# Altium footprint library Chip_Packaging.PcbLib: 101 footprints (part 4 of 7)
Each footprint in its own frame and in the unit in brackets; x right, y up, seen from the top. Pads: shape width x height; smd on the part's side, far side on the other; paste and mask are expansions set on the pad; w line width, h text height; cw(c..) or ccw(c..) is an arc to the next point about the centre after c.
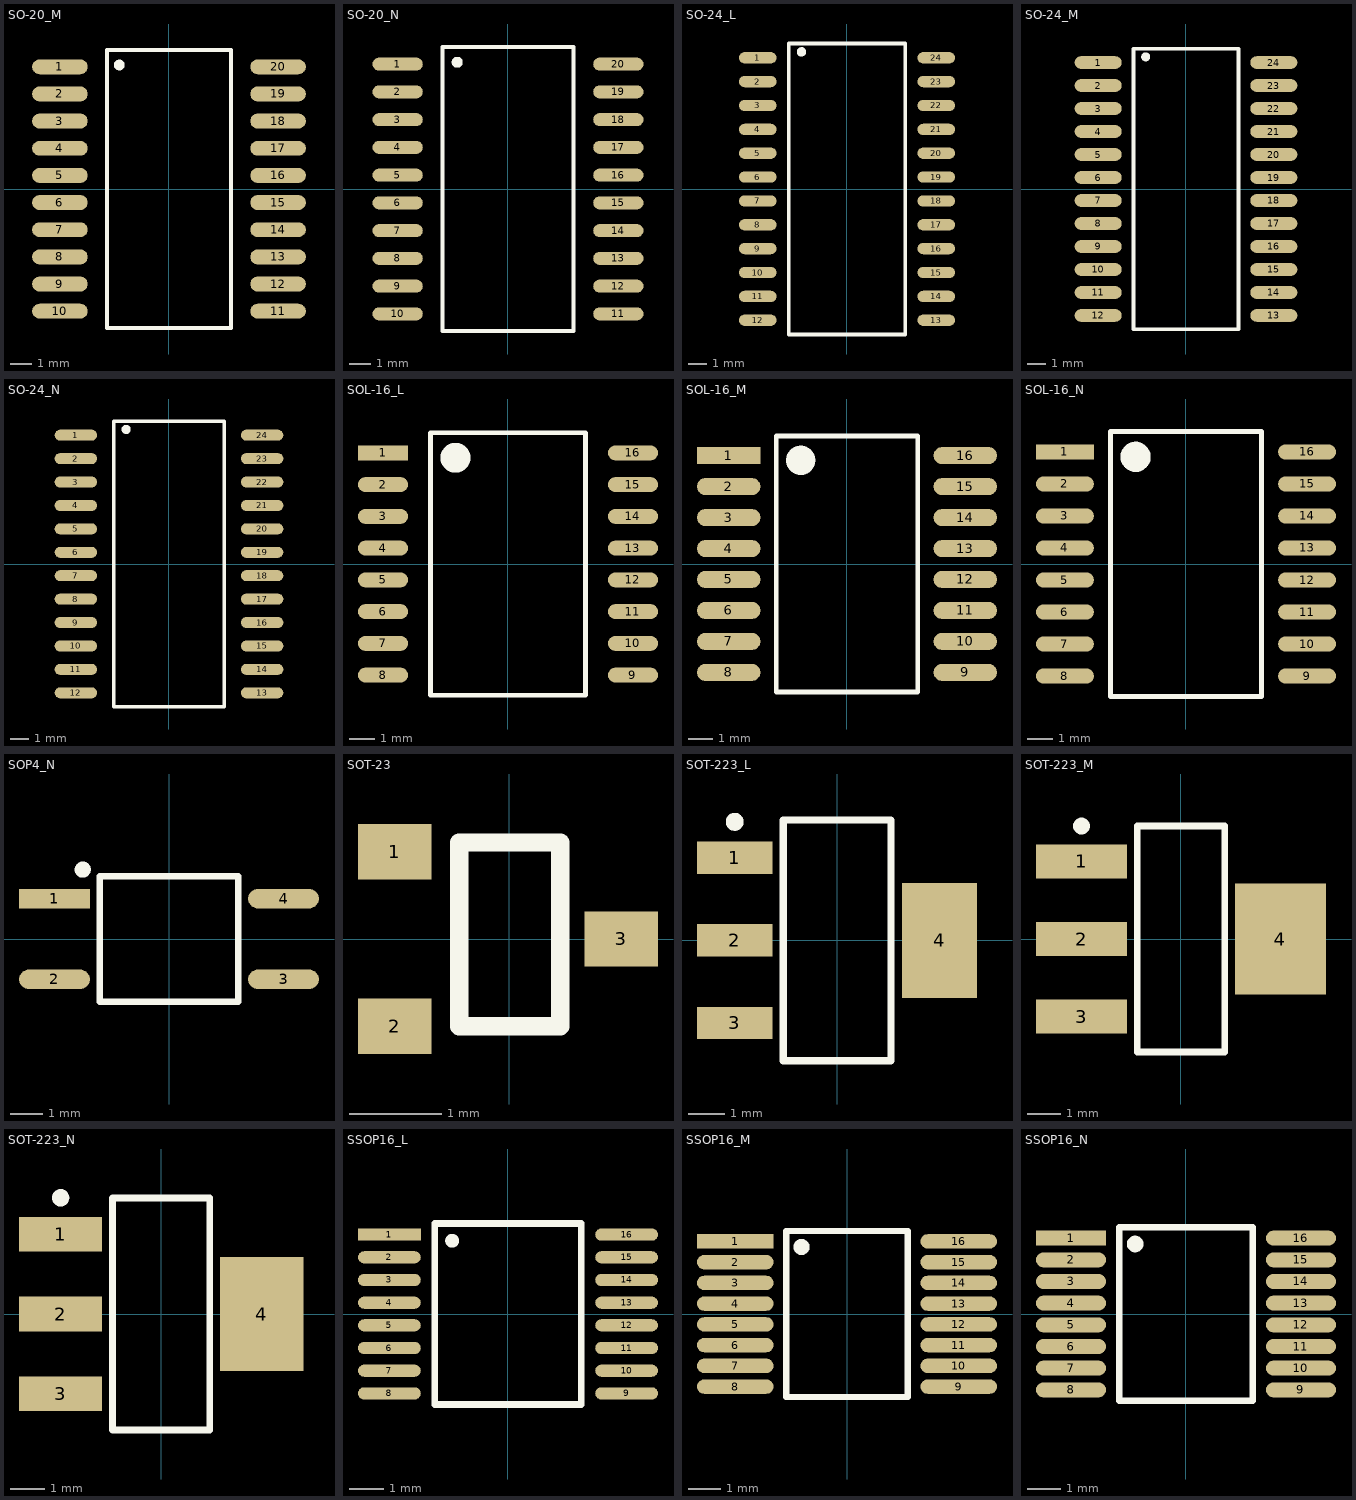
[diagram p3: the footprints below, top view; thin cyan lines are the x and y axes]

## SO-20_M [mm] "SOIC, 20-Leads, Body 12.8x7.5mm, Pitch 1.27mm, IPC Low Density"
height 2.65
pads (20):
  oval 2.6x0.7 smd: 1(-5.1,5.715) 2(-5.1,4.445) 3(-5.1,3.175) 4(-5.1,1.905) 5(-5.1,0.635) 6(-5.1,-0.635) 7(-5.1,-1.905) 8(-5.1,-3.175) 9(-5.1,-4.445) 10(-5.1,-5.715) 11(5.1,-5.715) 12(5.1,-4.445) 13(5.1,-3.175) 14(5.1,-1.905) 15(5.1,-0.635) 16(5.1,0.635) 17(5.1,1.905) 18(5.1,3.175) 19(5.1,4.445) 20(5.1,5.715)
Top Overlay:
  circle w0.25: c-2.325,5.8 r0.125
  lines w0.2: -2.9,-6.5 2.9,-6.5 2.9,6.5 -2.9,6.5 -2.9,-6.5
3D body "SO20.STEP": height 2.66, standoff 0, extent -5.315,-6.5 5.315,6.5

## SO-20_N [mm] "SOIC, 20-Leads, Body 12.8x7.5mm, Pitch 1.27mm, IPC Medium Density"
height 2.65
pads (20):
  oval 2.3x0.6 smd: 1(-5.05,5.715) 2(-5.05,4.445) 3(-5.05,3.175) 4(-5.05,1.905) 5(-5.05,0.635) 6(-5.05,-0.635) 7(-5.05,-1.905) 8(-5.05,-3.175) 9(-5.05,-4.445) 10(-5.05,-5.715) 11(5.05,-5.715) 12(5.05,-4.445) 13(5.05,-3.175) 14(5.05,-1.905) 15(5.05,-0.635) 16(5.05,0.635) 17(5.05,1.905) 18(5.05,3.175) 19(5.05,4.445) 20(5.05,5.715)
Top Overlay:
  circle w0.25: c-2.325,5.8 r0.125
  lines w0.2: -3,-6.5 3,-6.5 3,6.5 -3,6.5 -3,-6.5
3D body "SO20.STEP": height 2.66, standoff 0, extent -5.315,-6.5 5.315,6.5

## SO-24_L [mm] "SOIC, 24-Leads, Body 15.4x7.5mm, Pitch 1.27mm, IPC High Density"
height 2.65
pads (24):
  oval 2x0.6 smd: 1(-4.75,6.985) 2(-4.75,5.715) 3(-4.75,4.445) 4(-4.75,3.175) 5(-4.75,1.905) 6(-4.75,0.635) 7(-4.75,-0.635) 8(-4.75,-1.905) 9(-4.75,-3.175) 10(-4.75,-4.445) 11(-4.75,-5.715) 12(-4.75,-6.985) 13(4.75,-6.985) 14(4.75,-5.715) 15(4.75,-4.445) 16(4.75,-3.175) 17(4.75,-1.905) 18(4.75,-0.635) 19(4.75,0.635) 20(4.75,1.905) 21(4.75,3.175) 22(4.75,4.445) 23(4.75,5.715) 24(4.75,6.985)
Top Overlay:
  circle w0.25: c-2.425,7.3 r0.125
  lines w0.2: -3.1,-7.75 3.1,-7.75 3.1,7.75 -3.1,7.75 -3.1,-7.75
3D body "SO24.STEP": height 2.48, standoff 0, extent -5.155,-7.705 5.155,7.705

## SO-24_M [mm] "SOIC, 24-Leads, Body 15.4x7.5mm, Pitch 1.27mm, IPC Low Density"
height 2.65
pads (24):
  oval 2.6x0.7 smd: 1(-4.85,6.985) 2(-4.85,5.715) 3(-4.85,4.445) 4(-4.85,3.175) 5(-4.85,1.905) 6(-4.85,0.635) 7(-4.85,-0.635) 8(-4.85,-1.905) 9(-4.85,-3.175) 10(-4.85,-4.445) 11(-4.85,-5.715) 12(-4.85,-6.985) 13(4.85,-6.985) 14(4.85,-5.715) 15(4.85,-4.445) 16(4.85,-3.175) 17(4.85,-1.905) 18(4.85,-0.635) 19(4.85,0.635) 20(4.85,1.905) 21(4.85,3.175) 22(4.85,4.445) 23(4.85,5.715) 24(4.85,6.985)
Top Overlay:
  circle w0.25: c-2.225,7.3 r0.125
  lines w0.2: -2.9,-7.75 -2.9,7.75 2.9,7.75 2.9,-7.75 -2.9,-7.75
3D body "SO24.STEP": height 2.48, standoff 0, extent -5.155,-7.705 5.155,7.705

## SO-24_N [mm] "SOIC, 24-Leads, Body 15.4x7.5mm, Pitch 1.27mm, IPC Medium Density"
height 2.65
pads (24):
  oval 2.3x0.6 smd: 1(-5.05,6.985) 2(-5.05,5.715) 3(-5.05,4.445) 4(-5.05,3.175) 5(-5.05,1.905) 6(-5.05,0.635) 7(-5.05,-0.635) 8(-5.05,-1.905) 9(-5.05,-3.175) 10(-5.05,-4.445) 11(-5.05,-5.715) 12(-5.05,-6.985) 13(5.05,-6.985) 14(5.05,-5.715) 15(5.05,-4.445) 16(5.05,-3.175) 17(5.05,-1.905) 18(5.05,-0.635) 19(5.05,0.635) 20(5.05,1.905) 21(5.05,3.175) 22(5.05,4.445) 23(5.05,5.715) 24(5.05,6.985)
Top Overlay:
  circle w0.25: c-2.325,7.3 r0.125
  lines w0.2: -3,-7.75 -3,7.75 3,7.75 3,-7.75 -3,-7.75
3D body "SO24.STEP": height 2.48, standoff 0, extent -5.155,-7.705 5.155,7.705

## SOL-16_L [mm] "16-Pin Small Outline Integrated Circuit 1.27 mm Pitch, IPC High Density"
height 2.65
pads (16):
  rect 2x0.6 smd: 1(-5,4.445)
  oval 2x0.6 smd: 2(-5,3.175) 3(-5,1.905) 4(-5,0.635) 5(-5,-0.635) 6(-5,-1.905) 7(-5,-3.175) 8(-5,-4.445) 9(5,-4.445) 10(5,-3.175) 11(5,-1.905) 12(5,-0.635) 13(5,0.635) 14(5,1.905) 15(5,3.175) 16(5,4.445)
Top Overlay:
  circle w0.6: c-2.1,4.25 r0.3
  lines w0.2: -3.1,-5.25 -3.1,5.25 3.1,5.25 3.1,-5.25 -3.1,-5.25
3D body "SOL-16.STEP": height 1.75, standoff 0, extent -4.65,-4.9 4.65,5.1

## SOL-16_M [mm] "16-Pin Small Outline Integrated Circuit 1.27 mm Pitch, IPC Low Density"
height 2.65
pads (16):
  rect 2.6x0.7 smd: 1(-4.85,4.445)
  oval 2.6x0.7 smd: 2(-4.85,3.175) 3(-4.85,1.905) 4(-4.85,0.635) 5(-4.85,-0.635) 6(-4.85,-1.905) 7(-4.85,-3.175) 8(-4.85,-4.445) 9(4.85,-4.445) 10(4.85,-3.175) 11(4.85,-1.905) 12(4.85,-0.635) 13(4.85,0.635) 14(4.85,1.905) 15(4.85,3.175) 16(4.85,4.445)
Top Overlay:
  circle w0.6: c-1.9,4.25 r0.3
  lines w0.2: -2.9,-5.25 2.9,-5.25 2.9,5.25 -2.9,5.25 -2.9,-5.25
3D body "SOL-16.STEP": height 1.75, standoff 0, extent -4.65,-4.9 4.65,5.1

## SOL-16_N [mm] "16-Pin Small Outline Integrated Circuit 1.27 mm Pitch, IPC Medium Density"
height 2.65
pads (16):
  rect 2.3x0.6 smd: 1(-4.8,4.445)
  oval 2.3x0.6 smd: 2(-4.8,3.175) 3(-4.8,1.905) 4(-4.8,0.635) 5(-4.8,-0.635) 6(-4.8,-1.905) 7(-4.8,-3.175) 8(-4.8,-4.445) 9(4.8,-4.445) 10(4.8,-3.175) 11(4.8,-1.905) 12(4.8,-0.635) 13(4.8,0.635) 14(4.8,1.905) 15(4.8,3.175) 16(4.8,4.445)
Top Overlay:
  circle w0.6: c-2,4.25 r0.3
  lines w0.2: -3,-5.25 3,-5.25 3,5.25 -3,5.25 -3,-5.25
3D body "SOL-16.STEP": height 1.75, standoff 0, extent -4.65,-4.9 4.65,5.1

## SOP4_N [mm] "SOIC, 8-Leads, Body 4.5x4.5mm, Pitch 2.54mm, IPC Medium Density"
height 1.76
pads (4):
  rect 2.2x0.6 smd: 1(-3.55,1.25)
  oval 2.2x0.6 smd: 2(-3.55,-1.25) 3(3.55,-1.25) 4(3.55,1.25)
Top Overlay:
  circle w0.25: c-2.675,2.15 r0.125
  lines w0.2: -2.15,-1.95 2.15,-1.95 2.15,1.95 -2.15,1.95 -2.15,-1.95
3D body "SOP-4.STEP": height 2.02, standoff -0.02, extent -3.43,-2 3.43,2

## SOT-23 [mm]
pads (3):
  rect 0.8x0.6 smd: 1(-1.245,0.95) 2(-1.245,-0.95) 3(1.22,0)
Top Overlay:
  lines w0.2: -0.545,-0.95 -0.545,1.05 0.555,1.05 0.555,-0.95 -0.545,-0.95
3D body "SOT-23.STEP": height 1.08, standoff 0, extent -1.32,-1.5 1.32,1.5

## SOT-223_L [mm] "SOT223, 4-Leads, Body 6.5x3.5mm, Pitch 2.3mm, Lead Span 7mm, IPC High Density"
height 1.8
pads (4):
  rect 2.1x0.9 smd: 1(-2.85,2.3) 2(-2.85,0) 3(-2.85,-2.3)
  rect 2.1x3.2 smd: 4(2.85,0)
Top Overlay:
  circle w0.25: c-2.85,3.3 r0.125
  lines w0.2: -1.5,-3.35 -1.5,3.35 1.5,3.35 1.5,-3.35 -1.5,-3.35
3D body "SOT223.STEP": height 1.7, standoff 0, extent -3.5,-3.25 3.5,3.25

## SOT-223_M [mm] "SOT223, 4-Leads, Body 6.5x3.5mm, Pitch 2.3mm, Lead Span 7mm, IPC Low Density"
height 1.8
pads (4):
  rect 2.7x1 smd: 1(-2.95,2.3) 2(-2.95,0) 3(-2.95,-2.3)
  rect 2.7x3.3 smd: 4(2.95,0)
Top Overlay:
  circle w0.25: c-2.95,3.35 r0.125
  lines w0.2: -1.3,-3.35 -1.3,3.35 1.3,3.35 1.3,-3.35 -1.3,-3.35
3D body "SOT223.STEP": height 1.7, standoff 0, extent -3.5,-3.25 3.5,3.25

## SOT-223_N [mm] "SOT223, 4-Leads, Body 6.5x3.5mm, Pitch 2.3mm, Lead Span 7mm, IPC Medium Density"
height 1.8
pads (4):
  rect 2.4x1 smd: 1(-2.9,2.3) 2(-2.9,0) 3(-2.9,-2.3)
  rect 2.4x3.3 smd: 4(2.9,0)
Top Overlay:
  circle w0.25: c-2.9,3.35 r0.125
  lines w0.2: -1.4,-3.35 -1.4,3.35 1.4,3.35 1.4,-3.35 -1.4,-3.35
3D body "SOT223.STEP": height 1.7, standoff 0, extent -3.5,-3.25 3.5,3.25

## SSOP16_L [mm] "SOP, 16-Leads, Body 6.2x5.3mm, Pitch 0.65mm, IPC High Density"
height 1.99
pads (16):
  rect 1.8x0.35 smd: 1(-3.4,2.275)
  oval 1.8x0.35 smd: 2(-3.4,1.625) 3(-3.4,0.975) 4(-3.4,0.325) 5(-3.4,-0.325) 6(-3.4,-0.975) 7(-3.4,-1.625) 8(-3.4,-2.275) 9(3.4,-2.275) 10(3.4,-1.625) 11(3.4,-0.975) 12(3.4,-0.325) 13(3.4,0.325) 14(3.4,0.975) 15(3.4,1.625) 16(3.4,2.275)
Top Overlay:
  circle w0.2: c-1.6,2.1 r0.1
  lines w0.2: -2.1,-2.6 -2.1,2.6 2.1,2.6 2.1,-2.6 -2.1,-2.6
3D body "SSOP16.STEP": height 2, standoff 0, extent -3.2,-2.5 3.2,2.5

## SSOP16_M [mm] "SOP, 16-Leads, Body 6.2x5.3mm, Pitch 0.65mm, IPC Low Density"
height 1.99
pads (16):
  rect 2.4x0.45 smd: 1(-3.5,2.275)
  oval 2.4x0.45 smd: 2(-3.5,1.625) 3(-3.5,0.975) 4(-3.5,0.325) 5(-3.5,-0.325) 6(-3.5,-0.975) 7(-3.5,-1.625) 8(-3.5,-2.275) 9(3.5,-2.275) 10(3.5,-1.625) 11(3.5,-0.975) 12(3.5,-0.325) 13(3.5,0.325) 14(3.5,0.975) 15(3.5,1.625) 16(3.5,2.275)
Top Overlay:
  circle w0.25: c-1.425,2.1 r0.125
  lines w0.2: -1.9,-2.6 -1.9,2.6 1.9,2.6 1.9,-2.6 -1.9,-2.6
3D body "SSOP16.STEP": height 2, standoff 0, extent -3.2,-2.5 3.2,2.5

## SSOP16_N [mm] "SOP, 16-Leads, Body 6.2x5.3mm, Pitch 0.65mm, IPC Medium Density"
height 1.99
pads (16):
  rect 2.1x0.45 smd: 1(-3.45,2.275)
  oval 2.1x0.45 smd: 2(-3.45,1.625) 3(-3.45,0.975) 4(-3.45,0.325) 5(-3.45,-0.325) 6(-3.45,-0.975) 7(-3.45,-1.625) 8(-3.45,-2.275) 9(3.45,-2.275) 10(3.45,-1.625) 11(3.45,-0.975) 12(3.45,-0.325) 13(3.45,0.325) 14(3.45,0.975) 15(3.45,1.625) 16(3.45,2.275)
Top Overlay:
  circle w0.25: c-1.525,2.1 r0.125
  lines w0.2: -2,-2.6 -2,2.6 2,2.6 2,-2.6 -2,-2.6
3D body "SSOP16.STEP": height 2, standoff 0, extent -3.2,-2.5 3.2,2.5